# Altium footprint library SRAD_SAC_PcbLib.PcbLib: 33 footprints (part 1 of 3)
Each footprint in its own frame and in the unit in brackets; x right, y up, seen from the top. Pads: shape width x height; smd on the part's side, far side on the other; paste and mask are expansions set on the pad; w line width, h text height; cw(c..) or ccw(c..) is an arc to the next point about the centre after c.
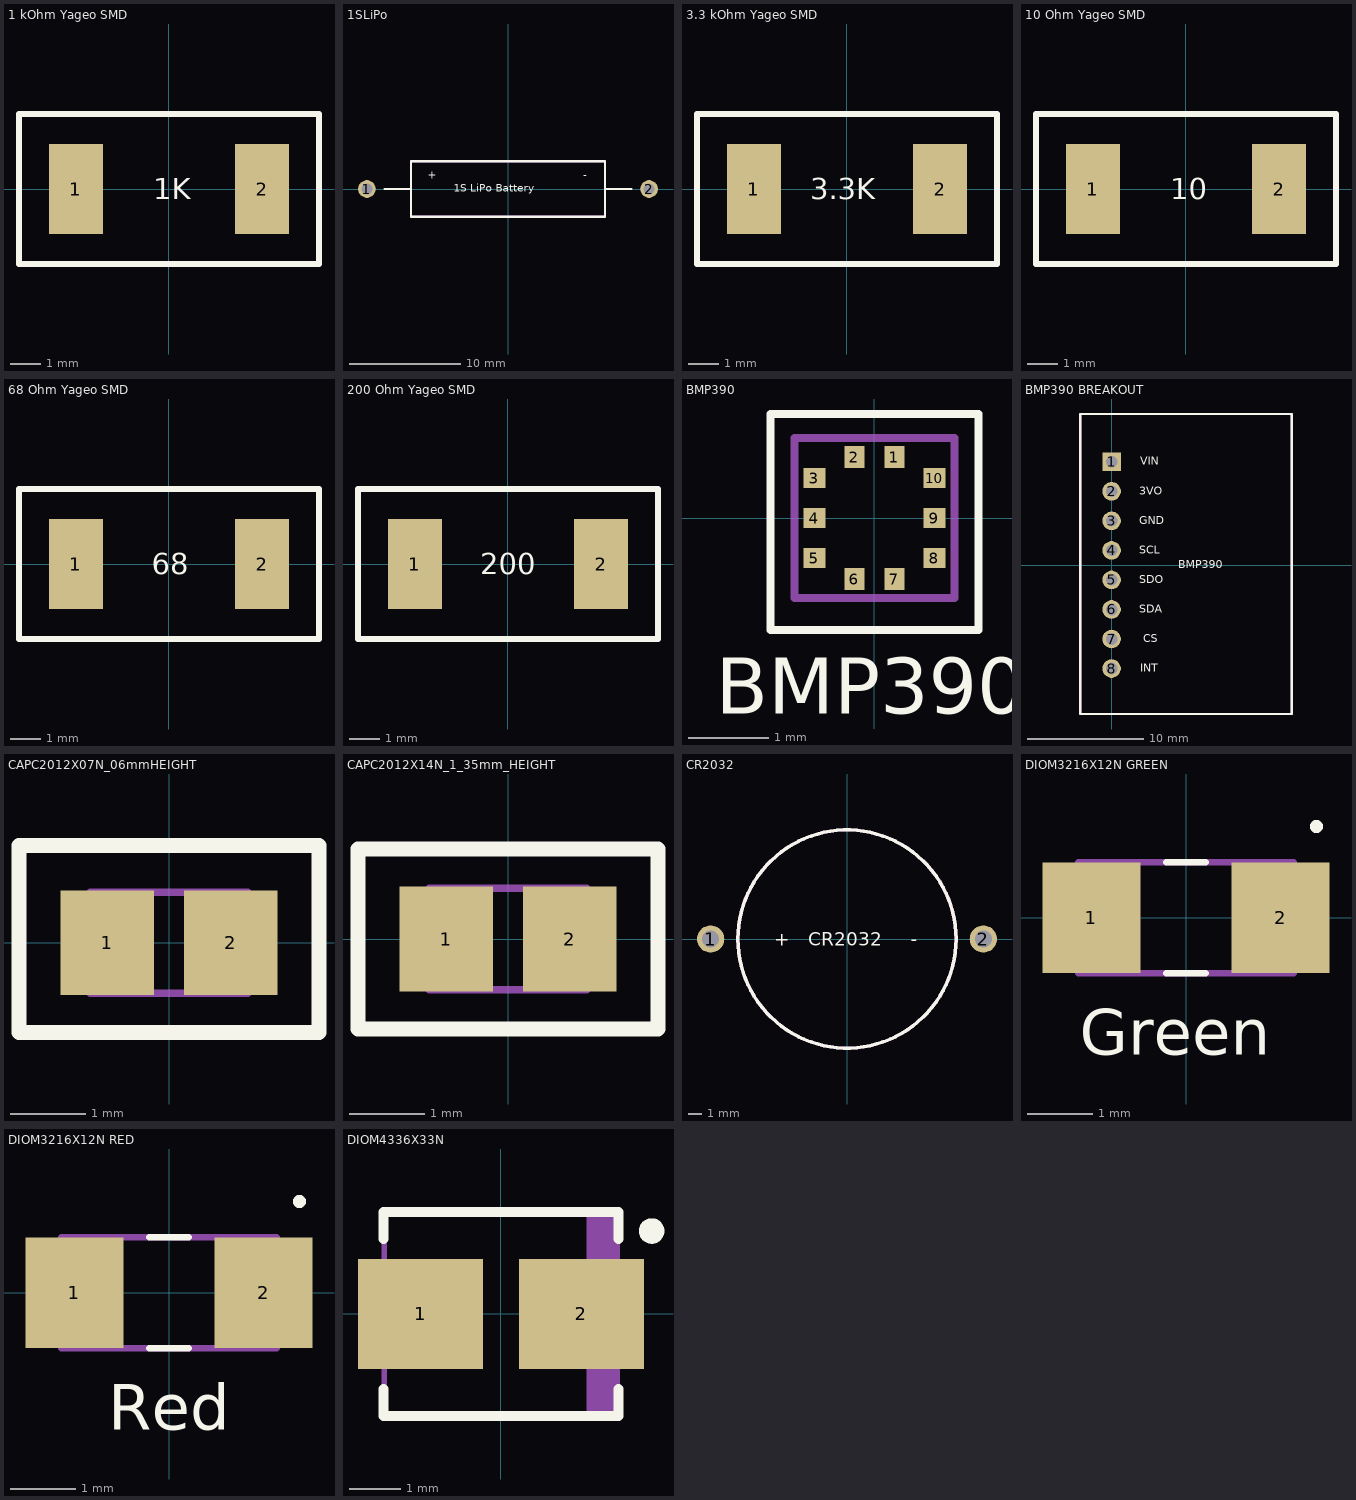
[diagram p0: the footprints below, top view; thin cyan lines are the x and y axes]

## 1 kOhm Yageo SMD [mm]
pads (2):
  rect 1.8x3 smd: 1(-3.1,0) 2(3.1,0)
Top Overlay:
  lines w0.2: -5,-2.5 5,-2.5 5,2.5 -5,2.5 -5,-2.5
  text "1K" at -0.525,-0.35 h0.7
Top Assembly:
  lines w0.2: -5,-2.5 5,-2.5 5,2.5 -5,2.5 -5,-2.5
  text ".Designator" at -3.499,-0.233 h0.7
3D body "Resistor_SMD_Yageo_2512.STEP": height 0.63, standoff -0.02, extent -3.175,-1.55 3.175,1.55

## 1SLiPo [mm]
pads (2):
  round 1.6 hole 1: 1(-12.7,0) 2(12.7,0)
Top Overlay:
  lines w0.2: -11.1,0 -8.725,0 ; 8.725,0 11.1,0 ; -8.725,0 -8.725,2.5 8.725,2.5 8.725,-2.5 -8.725,-2.5 -8.725,0
  text "1S LiPo Battery" at -4.898,-0.233 h0.7
  text "+" at -7.233,0.9 h0.7
  text "-" at 6.767,0.9 h0.7
Top Assembly:
  lines w0.2: -11.1,0 -8.725,0 ; 8.725,0 11.1,0 ; -8.725,0 -8.725,2.5 8.725,2.5 8.725,-2.5 -8.725,-2.5 -8.725,0
  text ".Designator" at -3.499,-0.233 h0.7

## 3.3 kOhm Yageo SMD [mm]
pads (2):
  rect 1.8x3 smd: 1(-3.1,0) 2(3.1,0)
Top Overlay:
  lines w0.2: -5,-2.5 5,-2.5 5,2.5 -5,2.5 -5,-2.5
  text "3.3K" at -1.225,-0.35 h0.7
Top Assembly:
  lines w0.2: -5,-2.5 5,-2.5 5,2.5 -5,2.5 -5,-2.5
  text ".Designator" at -3.499,-0.233 h0.7
3D body "Resistor_SMD_Yageo_2512.STEP": height 0.63, standoff -0.02, extent -3.175,-1.55 3.175,1.55

## 10 Ohm Yageo SMD [mm]
pads (2):
  rect 1.8x3 smd: 1(-3.1,0) 2(3.1,0)
Top Overlay:
  lines w0.2: -5,-2.5 -5,2.5 5,2.5 5,-2.5 -5,-2.5
  text "10" at -0.525,-0.35 h0.7
Top Assembly:
  lines w0.2: -5,-2.5 -5,2.5 5,2.5 5,-2.5 -5,-2.5
  text ".Designator" at -3.499,-0.233 h0.7
3D body "Resistor_SMD_Yageo_2512.STEP": height 0.63, standoff -0.02, extent -3.175,-1.55 3.175,1.55

## 68 Ohm Yageo SMD [mm]
pads (2):
  rect 1.8x3 smd: 1(-3.1,0) 2(3.1,0)
Top Overlay:
  lines w0.2: -5,-2.5 -5,2.5 5,2.5 5,-2.5 -5,-2.5
  text "68" at -0.583,-0.35 h0.7
Top Assembly:
  lines w0.2: -5,-2.5 -5,2.5 5,2.5 5,-2.5 -5,-2.5
  text ".Designator" at -3.499,-0.233 h0.7
3D body "Resistor_SMD_Yageo_2512.STEP": height 0.63, standoff -0.02, extent -3.175,-1.55 3.175,1.55

## 200 Ohm Yageo SMD [mm]
pads (2):
  rect 1.8x3 smd: 1(-3.1,0) 2(3.1,0)
Top Overlay:
  lines w0.2: -5,-2.5 -5,2.5 5,2.5 5,-2.5 -5,-2.5
  text "200" at -0.933,-0.35 h0.7
Top Assembly:
  lines w0.2: -5,-2.5 -5,2.5 5,2.5 5,-2.5 -5,-2.5
  text ".Designator" at -3.499,-0.233 h0.7
3D body "Resistor_SMD_Yageo_2512.STEP": height 0.63, standoff -0.02, extent -3.175,-1.55 3.175,1.55

## Barrier Screw Terminal [mm]

## BMP390 [mm] "LGA, 20-Leads, Body 2.00x2.00mmx0.80mm, Pitch 0.50mm"
height 0.8
pads (10):
  rect 0.25x0.275 smd mask+0.05: 1(0.25,0.763) 2(-0.25,0.763) 6(-0.25,-0.763) 7(0.25,-0.763)
  rect 0.275x0.25 smd mask+0.05: 3(-0.75,0.5) 4(-0.75,0) 5(-0.75,-0.5) 8(0.75,-0.5) 9(0.75,0) 10(0.75,0.5)
Top Overlay:
  lines w0.1: -1.3,-1.4 -1.3,1.3 1.3,1.3 1.3,-1.4 -1.3,-1.4
  text "BMP390" at -1.983,-2.45 h0.7
Top Assembly:
  lines w0.1: -1,-1 -1,1 1,1 1,-1 -1,-1
  text ".Designator" at -3.499,-0.233 h0.7
3D body "BMP390_LGA_Chip.step": height 0.81, standoff 0, extent -1.029,-1.029 1.029,1.029

## BMP390 BREAKOUT [mm] "Adafruit Breakout Board for BMP390"
pads (8):
  rect 1.6x1.6 hole 1: 1(0,8.89)
  round 1.6 hole 1: 2(0,6.35) 3(0,3.81) 4(0,1.27) 5(0,-1.27) 6(0,-3.81) 7(0,-6.35) 8(0,-8.89)
Top Overlay:
  lines w0.2: -2.7,-12.8 15.5,-12.8 15.5,13 -2.7,13 -2.7,-12.8
  text "INT" at 2.45,-9.165 h0.7
  text "CS" at 2.742,-6.625 h0.7
  text "SDA" at 2.392,-4.085 h0.7
  text "SDO" at 2.392,-1.545 h0.7
  text "SCL" at 2.392,0.995 h0.7
  text "GND" at 2.392,3.535 h0.7
  text "3VO" at 2.392,6.075 h0.7
  text "VIN" at 2.45,8.615 h0.7
  text "BMP390" at 5.717,-0.275 h0.7
Top Assembly:
  lines w0.2: -2.7,-12.8 -2.7,13 15.5,13 15.5,-12.8 -2.7,-12.8
  text ".Designator" at 4.286,-0.233 h0.7
3D body "BMP390_V00.step": height 2.01, standoff 0.01, extent -2.49,-12.65 15.29,12.75

## CAPC2012X07N_06mmHEIGHT [mm] "Chip Capacitor, 2-Leads, Body 2.00x1.25mm, IPC Medium Density"
height 0.7
pads (2):
  rect 1.25x1.4 smd: 1(-0.825,0) 2(0.825,0)
Top Overlay:
  lines w0.2: -2,-1.2 -2,1.3 2,1.3 2,-1.2 -2,-1.2
Top Assembly:
  lines w0.1: -1.05,-0.675 1.05,-0.675 1.05,0.675 -1.05,0.675 -1.05,-0.675
  text ".Designator" at -3.499,-0.233 h0.7
3D body "CAPC2012X07N.step": height 0.7, standoff 0, extent -1.05,-0.675 1.05,0.675

## CAPC2012X14N_1_35mm_HEIGHT [mm] "Chip Capacitor, 2-Leads, Body 2.00x1.25mm, IPC Medium Density"
height 1.45
pads (2):
  rect 1.25x1.4 smd: 1(-0.825,0) 2(0.825,0)
Top Overlay:
  lines w0.2: -2,-1.2 -2,1.2 2,1.2 2,-1.2 -2,-1.2
Top Assembly:
  lines w0.1: -1.05,-0.675 -1.05,0.675 1.05,0.675 1.05,-0.675 -1.05,-0.675
  text ".Designator" at -3.499,-0.233 h0.7
3D body "CAPC2012X14N.step": height 1.45, standoff 0, extent -1.05,-0.675 1.05,0.675

## CR2032 [mm]
pads (2):
  round 2 hole 1.25: 1(-10,0) 2(10,0)
Top Overlay:
  circle w0.254: c0,0 r8
  text "-" at 4.667,-0.5 h1
  text "+" at -5.333,-0.5 h1
  text "CR2032" at -2.832,-0.5 h1
Top Assembly:
  circle w0.254: c0,0 r8
  text ".Designator" at -3.499,-0.233 h0.7
3D body "CR2032_CoinCellBattery.step": height 8.7, standoff -3.7, extent -11.25,-11.125 13.038,10.975

## DIOM3216X12N GREEN [mm] "Molded Diode, 2-Leads, Body 3.20x1.60mm, IPC Medium Density"
height 1.2
pads (2):
  rect 1.5x1.7 smd: 1(-1.45,0) 2(1.45,0)
Top Overlay:
  circle w0.1: c2,1.4 r0.05
  lines w0.1: -0.3,-0.85 0.3,-0.85 ; -0.3,0.85 0.3,0.85
  text "Green" at -1.633,-2.1 h0.7
Top Assembly:
  rectangle: 1.206,-0.85 1.65,0.85
  lines w0.1: -1.65,-0.85 1.65,-0.85 1.65,0.85 -1.65,0.85 -1.65,-0.85
  text ".Designator" at -3.499,-0.233 h0.7
3D body "DIOM3216X12N.step": height 1.2, standoff 0, extent -1.87,-0.85 1.87,0.85

## DIOM3216X12N RED [mm] "Molded Diode, 2-Leads, Body 3.20x1.60mm, IPC Medium Density"
height 1.2
pads (2):
  rect 1.5x1.7 smd: 1(-1.45,0) 2(1.45,0)
Top Overlay:
  circle w0.1: c2,1.4 r0.05
  lines w0.1: -0.3,-0.85 0.3,-0.85 ; -0.3,0.85 0.3,0.85
  text "Red" at -0.933,-2.1 h0.7
Top Assembly:
  rectangle: 1.206,-0.85 1.65,0.85
  lines w0.1: -1.65,-0.85 -1.65,0.85 1.65,0.85 1.65,-0.85 -1.65,-0.85
  text ".Designator" at -3.499,-0.233 h0.7
3D body "DIOM3216X12N.step": height 1.2, standoff 0, extent -1.87,-0.85 1.87,0.85

## DIOM4336X33N [mm] "Molded Diode, 2-Leads, Body 4.31x3.62mm, IPC Medium Density"
height 3.3
pads (2):
  rect 2.45x2.15 smd: 1(-1.575,0) 2(1.575,0)
Top Overlay:
  circle w0.25: c2.95,1.625 r0.125
  lines w0.2: -2.3,-1.475 -2.3,-2 2.3,-2 2.3,-1.475 ; -2.3,1.475 -2.3,2 2.3,2 2.3,1.475
Top Assembly:
  rectangle: 1.67,-1.97 2.285,1.97
  lines w0.1: -2.285,-1.97 2.285,-1.97 2.285,1.97 -2.285,1.97 -2.285,-1.97
  text ".Designator" at -3.499,-0.233 h0.7
3D body "DIOM4336X33N.step": height 3.3, standoff 0, extent -2.505,-1.97 2.505,1.97

## ematch [mm]